# Altium footprint library ref-packages-longpad.PCBLIB: 1527 footprints (part 65 of 103)
Each footprint in its own frame and in the unit in brackets; x right, y up, seen from the top. Pads: shape width x height; smd on the part's side, far side on the other; paste and mask are expansions set on the pad; w line width, h text height; cw(c..) or ccw(c..) is an arc to the next point about the centre after c.
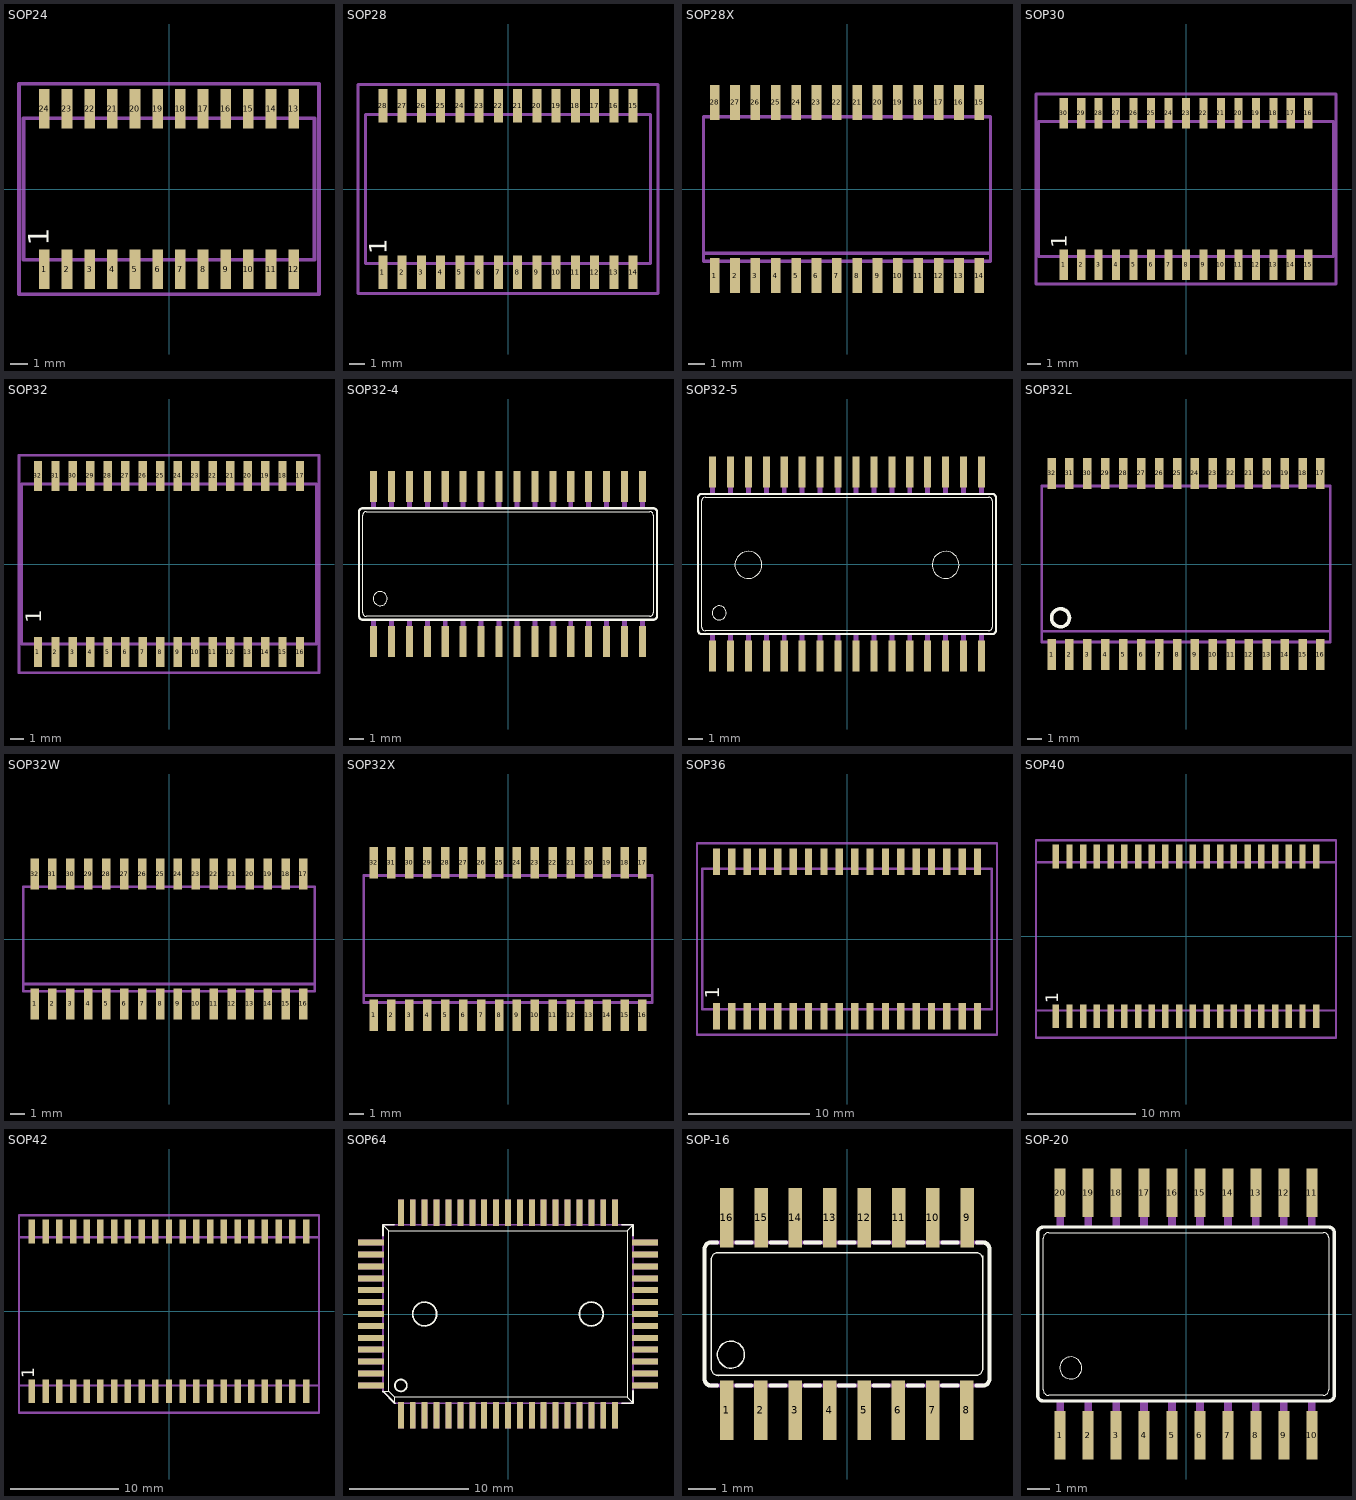
[diagram p64: the footprints below, top view; thin cyan lines are the x and y axes]

## SOP24 [mil]
pads (24):
  rect 23.62x86.61 smd: 1(-275,-177.17) 2(-225,-177.17) 3(-175,-177.17) 4(-125,-177.17) 5(-75,-177.17) 6(-25,-177.17) 7(25,-177.17) 8(75,-177.17) 9(125,-177.17) 10(175,-177.17) 11(225,-177.17) 12(275,-177.17) 13(275,177.17) 14(225,177.17) 15(175,177.17) 16(125,177.17) 17(75,177.17) 18(25,177.17) 19(-25,177.17) 20(-75,177.17) 21(-125,177.17) 22(-175,177.17) 23(-225,177.17) 24(-275,177.17)
Top Overlay:
  text "1" at -250,-125 h77.5
Mechanical 16:
  rectangle: -284.84,-212.2 -265.16,-159.84
  rectangle: -234.84,-212.2 -215.16,-159.84
  rectangle: -184.84,-212.2 -165.16,-159.84
  rectangle: -134.84,-212.2 -115.16,-159.84
  rectangle: -84.84,-212.2 -65.16,-159.84
  rectangle: -34.84,-212.2 -15.16,-159.84
  rectangle: 15.16,-212.2 34.84,-159.84
  rectangle: 65.16,-212.2 84.84,-159.84
  rectangle: 115.16,-212.2 134.84,-159.84
  rectangle: 165.16,-212.2 184.84,-159.84
  rectangle: 215.16,-212.2 234.84,-159.84
  rectangle: 265.16,-212.2 284.84,-159.84
  rectangle: 265.16,159.84 284.84,212.2
  rectangle: 215.16,159.84 234.84,212.2
  rectangle: 165.16,159.84 184.84,212.2
  rectangle: 115.16,159.84 134.84,212.2
  rectangle: 65.16,159.84 84.84,212.2
  rectangle: 15.16,159.84 34.84,212.2
  rectangle: -34.84,159.84 -15.16,212.2
  rectangle: -84.84,159.84 -65.16,212.2
  rectangle: -134.84,159.84 -115.16,212.2
  rectangle: -184.84,159.84 -165.16,212.2
  rectangle: -234.84,159.84 -215.16,212.2
  rectangle: -284.84,159.84 -265.16,212.2
  lines w8: -320.67,-155.91 320.67,-155.91 320.67,155.91 -320.67,155.91 -320.67,-155.91
Mechanical 27:
  lines w7.87: -330.71,-232.28 -330.71,232.28 330.71,232.28 330.71,-232.28 -330.71,-232.28

## SOP28 [mil]
pads (28):
  rect 23.62x86.61 smd: 1(-325,-216.54) 2(-275,-216.54) 3(-225,-216.54) 4(-175,-216.54) 5(-125,-216.54) 6(-75,-216.54) 7(-25,-216.54) 8(25,-216.54) 9(75,-216.54) 10(125,-216.54) 11(175,-216.54) 12(225,-216.54) 13(275,-216.54) 14(325,-216.54) 15(325,216.54) 16(275,216.54) 17(225,216.54) 18(175,216.54) 19(125,216.54) 20(75,216.54) 21(25,216.54) 22(-25,216.54) 23(-75,216.54) 24(-125,216.54) 25(-175,216.54) 26(-225,216.54) 27(-275,216.54) 28(-325,216.54)
Top Overlay:
  text "1" at -300,-169.69 h77.5
Mechanical 16:
  rectangle: -334.84,-249.61 -315.16,-197.24
  rectangle: -284.84,-249.61 -265.16,-197.24
  rectangle: -234.84,-249.61 -215.16,-197.24
  rectangle: -184.84,-249.61 -165.16,-197.24
  rectangle: -134.84,-249.61 -115.16,-197.24
  rectangle: -84.84,-249.61 -65.16,-197.24
  rectangle: -34.84,-249.61 -15.16,-197.24
  rectangle: 15.16,-249.61 34.84,-197.24
  rectangle: 65.16,-249.61 84.84,-197.24
  rectangle: 115.16,-249.61 134.84,-197.24
  rectangle: 165.16,-249.61 184.84,-197.24
  rectangle: 215.16,-249.61 234.84,-197.24
  rectangle: 265.16,-249.61 284.84,-197.24
  rectangle: 315.16,-249.61 334.84,-197.24
  rectangle: 315.16,197.24 334.84,249.61
  rectangle: 265.16,197.24 284.84,249.61
  rectangle: 215.16,197.24 234.84,249.61
  rectangle: 165.16,197.24 184.84,249.61
  rectangle: 115.16,197.24 134.84,249.61
  rectangle: 65.16,197.24 84.84,249.61
  rectangle: 15.16,197.24 34.84,249.61
  rectangle: -34.84,197.24 -15.16,249.61
  rectangle: -84.84,197.24 -65.16,249.61
  rectangle: -134.84,197.24 -115.16,249.61
  rectangle: -184.84,197.24 -165.16,249.61
  rectangle: -234.84,197.24 -215.16,249.61
  rectangle: -284.84,197.24 -265.16,249.61
  rectangle: -334.84,197.24 -315.16,249.61
  lines w8: -370.67,-193.31 370.67,-193.31 370.67,193.31 -370.67,193.31 -370.67,-193.31
Mechanical 27:
  lines w7.87: -389.76,-271.65 -389.76,271.65 389.76,271.65 389.76,-271.65 -389.76,-271.65

## SOP28X [mil]
pads (28):
  rect 23.62x86.61 smd: 1(-325,-212.6) 2(-275,-212.6) 3(-225,-212.6) 4(-175,-212.6) 5(-125,-212.6) 6(-75,-212.6) 7(-25,-212.6) 8(25,-212.6) 9(75,-212.6) 10(125,-212.6) 11(175,-212.6) 12(225,-212.6) 13(275,-212.6) 14(325,-212.6) 15(325,212.6) 16(275,212.6) 17(225,212.6) 18(175,212.6) 19(125,212.6) 20(75,212.6) 21(25,212.6) 22(-25,212.6) 23(-75,212.6) 24(-125,212.6) 25(-175,212.6) 26(-225,212.6) 27(-275,212.6) 28(-325,212.6)
Mechanical 16:
  rectangle: -334.65,-240.94 -315.35,-181.1
  rectangle: -284.65,-240.94 -265.35,-181.1
  rectangle: -234.65,-240.94 -215.35,-181.1
  rectangle: -184.65,-240.94 -165.35,-181.1
  rectangle: -134.65,-240.94 -115.35,-181.1
  rectangle: -84.65,-240.94 -65.35,-181.1
  rectangle: -34.65,-240.94 -15.35,-181.1
  rectangle: 15.35,-240.94 34.65,-181.1
  rectangle: 65.35,-240.94 84.65,-181.1
  rectangle: 115.35,-240.94 134.65,-181.1
  rectangle: 165.35,-240.94 184.65,-181.1
  rectangle: 215.35,-240.94 234.65,-181.1
  rectangle: 265.35,-240.94 284.65,-181.1
  rectangle: 315.35,-240.94 334.65,-181.1
  rectangle: 315.35,181.1 334.65,240.94
  rectangle: 265.35,181.1 284.65,240.94
  rectangle: 215.35,181.1 234.65,240.94
  rectangle: 165.35,181.1 184.65,240.94
  rectangle: 115.35,181.1 134.65,240.94
  rectangle: 65.35,181.1 84.65,240.94
  rectangle: 15.35,181.1 34.65,240.94
  rectangle: -34.65,181.1 -15.35,240.94
  rectangle: -84.65,181.1 -65.35,240.94
  rectangle: -134.65,181.1 -115.35,240.94
  rectangle: -184.65,181.1 -165.35,240.94
  rectangle: -234.65,181.1 -215.35,240.94
  rectangle: -284.65,181.1 -265.35,240.94
  rectangle: -334.65,181.1 -315.35,240.94
  lines w8: -352.36,-157.48 -352.36,-177.17 352.36,-177.17 352.36,-157.48 ; -352.36,-157.48 -352.36,177.17 352.36,177.17 352.36,-157.48 ; -352.36,-157.48 352.36,-157.48

## SOP30 [mil]
pads (30):
  rect 23.62x86.61 smd: 1(-350,-216.54) 2(-300,-216.54) 3(-250,-216.54) 4(-200,-216.54) 5(-150,-216.54) 6(-100,-216.54) 7(-50,-216.54) 8(0,-216.54) 9(50,-216.54) 10(100,-216.54) 11(150,-216.54) 12(200,-216.54) 13(250,-216.54) 14(300,-216.54) 15(350,-216.54) 16(350,216.54) 17(300,216.54) 18(250,216.54) 19(200,216.54) 20(150,216.54) 21(100,216.54) 22(50,216.54) 23(0,216.54) 24(-50,216.54) 25(-100,216.54) 26(-150,216.54) 27(-200,216.54) 28(-250,216.54) 29(-300,216.54) 30(-350,216.54)
Top Overlay:
  text "1" at -325,-169.69 h77.5
Mechanical 16:
  rectangle: -359.84,-249.61 -340.16,-197.24
  rectangle: -309.84,-249.61 -290.16,-197.24
  rectangle: -259.84,-249.61 -240.16,-197.24
  rectangle: -209.84,-249.61 -190.16,-197.24
  rectangle: -159.84,-249.61 -140.16,-197.24
  rectangle: -109.84,-249.61 -90.16,-197.24
  rectangle: -59.84,-249.61 -40.16,-197.24
  rectangle: -9.84,-249.61 9.84,-197.24
  rectangle: 40.16,-249.61 59.84,-197.24
  rectangle: 90.16,-249.61 109.84,-197.24
  rectangle: 140.16,-249.61 159.84,-197.24
  rectangle: 190.16,-249.61 209.84,-197.24
  rectangle: 240.16,-249.61 259.84,-197.24
  rectangle: 290.16,-249.61 309.84,-197.24
  rectangle: 340.16,-249.61 359.84,-197.24
  rectangle: 340.16,197.24 359.84,249.61
  rectangle: 290.16,197.24 309.84,249.61
  rectangle: 240.16,197.24 259.84,249.61
  rectangle: 190.16,197.24 209.84,249.61
  rectangle: 140.16,197.24 159.84,249.61
  rectangle: 90.16,197.24 109.84,249.61
  rectangle: 40.16,197.24 59.84,249.61
  rectangle: -9.84,197.24 9.84,249.61
  rectangle: -59.84,197.24 -40.16,249.61
  rectangle: -109.84,197.24 -90.16,249.61
  rectangle: -159.84,197.24 -140.16,249.61
  rectangle: -209.84,197.24 -190.16,249.61
  rectangle: -259.84,197.24 -240.16,249.61
  rectangle: -309.84,197.24 -290.16,249.61
  rectangle: -359.84,197.24 -340.16,249.61
  lines w8: -421.26,-193.31 421.26,-193.31 421.26,193.31 -421.26,193.31 -421.26,-193.31
Mechanical 27:
  lines w7.87: -429.13,-271.65 -429.13,271.65 429.13,271.65 429.13,-271.65 -429.13,-271.65

## SOP32 [mil]
pads (32):
  rect 23.62x86.61 smd: 1(-375,-251.97) 2(-325,-251.97) 3(-275,-251.97) 4(-225,-251.97) 5(-175,-251.97) 6(-125,-251.97) 7(-75,-251.97) 8(-25,-251.97) 9(25,-251.97) 10(75,-251.97) 11(125,-251.97) 12(175,-251.97) 13(225,-251.97) 14(275,-251.97) 15(325,-251.97) 16(375,-251.97) 17(375,251.97) 18(325,251.97) 19(275,251.97) 20(225,251.97) 21(175,251.97) 22(125,251.97) 23(75,251.97) 24(25,251.97) 25(-25,251.97) 26(-75,251.97) 27(-125,251.97) 28(-175,251.97) 29(-225,251.97) 30(-275,251.97) 31(-325,251.97) 32(-375,251.97)
Top Overlay:
  text "1" at -350,-169.69 h77.5
Mechanical 16:
  rectangle: -384.84,-285.04 -365.16,-232.68
  rectangle: -334.84,-285.04 -315.16,-232.68
  rectangle: -284.84,-285.04 -265.16,-232.68
  rectangle: -234.84,-285.04 -215.16,-232.68
  rectangle: -184.84,-285.04 -165.16,-232.68
  rectangle: -134.84,-285.04 -115.16,-232.68
  rectangle: -84.84,-285.04 -65.16,-232.68
  rectangle: -34.84,-285.04 -15.16,-232.68
  rectangle: 15.16,-285.04 34.84,-232.68
  rectangle: 65.16,-285.04 84.84,-232.68
  rectangle: 115.16,-285.04 134.84,-232.68
  rectangle: 165.16,-285.04 184.84,-232.68
  rectangle: 215.16,-285.04 234.84,-232.68
  rectangle: 265.16,-285.04 284.84,-232.68
  rectangle: 315.16,-285.04 334.84,-232.68
  rectangle: 365.16,-285.04 384.84,-232.68
  rectangle: 365.16,232.68 384.84,285.04
  rectangle: 315.16,232.68 334.84,285.04
  rectangle: 265.16,232.68 284.84,285.04
  rectangle: 215.16,232.68 234.84,285.04
  rectangle: 165.16,232.68 184.84,285.04
  rectangle: 115.16,232.68 134.84,285.04
  rectangle: 65.16,232.68 84.84,285.04
  rectangle: 15.16,232.68 34.84,285.04
  rectangle: -34.84,232.68 -15.16,285.04
  rectangle: -84.84,232.68 -65.16,285.04
  rectangle: -134.84,232.68 -115.16,285.04
  rectangle: -184.84,232.68 -165.16,285.04
  rectangle: -234.84,232.68 -215.16,285.04
  rectangle: -284.84,232.68 -265.16,285.04
  rectangle: -334.84,232.68 -315.16,285.04
  rectangle: -384.84,232.68 -365.16,285.04
  lines w8: -421.26,-228.74 421.26,-228.74 421.26,228.74 -421.26,228.74 -421.26,-228.74
Mechanical 27:
  lines w7.87: -429.13,-311.02 -429.13,311.02 429.13,311.02 429.13,-311.02 -429.13,-311.02

## SOP32-4 [mil]
pads (32):
  rect 19.69x86.61 smd: 1(-375,-216.54) 2(-325,-216.54) 3(-275,-216.54) 4(-225,-216.54) 5(-175,-216.54) 6(-125,-216.54) 7(-75,-216.54) 8(-25,-216.54) 9(25,-216.54) 10(75,-216.54) 11(125,-216.54) 12(175,-216.54) 13(225,-216.54) 14(275,-216.54) 15(325,-216.54) 16(375,-216.54) 17(375,216.54) 18(325,216.54) 19(275,216.54) 20(225,216.54) 21(175,216.54) 22(125,216.54) 23(75,216.54) 24(25,216.54) 25(-25,216.54) 26(-75,216.54) 27(-125,216.54) 28(-175,216.54) 29(-225,216.54) 30(-275,216.54) 31(-325,216.54) 32(-375,216.54)
Top Overlay:
  circle w2: c-356.1,-96.46 r19.69
  lines w2: -405.32,-135.83 -405.32,135.83 cw(c-395.48,135.82) -395.47,145.67 395.87,145.67 cw(c395.67,136.02) 405.32,136.22 405.32,-135.83 cw(c395.48,-135.82) 395.47,-145.67 -395.47,-145.67 cw(c-395.48,-135.82) -405.32,-135.83
  lines w6: -405.35,155.51 -405.32,155.51 ; -405.32,155.51 405.32,155.51 cw(c405.32,145.67) 415.16,145.67 415.16,-145.67 cw(c405.32,-145.67) 405.32,-155.51 -405.32,-155.51 cw(c-405.33,-145.67) -415.16,-146.06 -415.16,145.67 cw(c-405.32,145.67) -405.32,155.51
Mechanical 16:
  rectangle: -281.89,155.51 -268.11,236.22
  rectangle: -231.89,155.51 -218.11,236.22
  rectangle: -181.89,155.51 -168.11,236.22
  rectangle: -131.89,155.51 -118.11,236.22
  rectangle: -81.89,155.51 -68.11,236.22
  rectangle: -31.89,155.51 -18.11,236.22
  rectangle: 18.11,155.51 31.89,236.22
  rectangle: 68.11,155.51 81.89,236.22
  rectangle: 118.11,155.51 131.89,236.22
  rectangle: 168.11,155.51 181.89,236.22
  rectangle: 218.11,155.51 231.89,236.22
  rectangle: 268.11,155.51 281.89,236.22
  rectangle: -281.89,-236.22 -268.11,-155.51
  rectangle: -231.89,-236.22 -218.11,-155.51
  rectangle: -181.89,-236.22 -168.11,-155.51
  rectangle: -131.89,-236.22 -118.11,-155.51
  rectangle: -81.89,-236.22 -68.11,-155.51
  rectangle: -31.89,-236.22 -18.11,-155.51
  rectangle: 18.11,-236.22 31.89,-155.51
  rectangle: 68.11,-236.22 81.89,-155.51
  rectangle: 118.11,-236.22 131.89,-155.51
  rectangle: 168.11,-236.22 181.89,-155.51
  rectangle: 218.11,-236.22 231.89,-155.51
  rectangle: 268.11,-236.22 281.89,-155.51
  rectangle: 318.11,155.51 331.89,236.22
  rectangle: 368.11,155.51 381.89,236.22
  rectangle: 318.11,-236.22 331.89,-155.51
  rectangle: 368.11,-236.22 381.89,-155.51
  rectangle: -381.89,155.51 -368.11,236.22
  rectangle: -331.89,155.51 -318.11,236.22
  rectangle: -381.89,-236.22 -368.11,-155.51
  rectangle: -331.89,-236.22 -318.11,-155.51

## SOP32-5 [mil]
pads (32):
  rect 19.69x86.61 smd: 1(-375,-256.54) 2(-325,-256.54) 3(-275,-256.54) 4(-225,-256.54) 5(-175,-256.54) 6(-125,-256.54) 7(-75,-256.54) 8(-25,-256.54) 9(25,-256.54) 10(75,-256.54) 11(125,-256.54) 12(175,-256.54) 13(225,-256.54) 14(275,-256.54) 15(325,-256.54) 16(375,-256.54) 17(375,256.54) 18(325,256.54) 19(275,256.54) 20(225,256.54) 21(175,256.54) 22(125,256.54) 23(75,256.54) 24(25,256.54) 25(-25,256.54) 26(-75,256.54) 27(-125,256.54) 28(-175,256.54) 29(-225,256.54) 30(-275,256.54) 31(-325,256.54) 32(-375,256.54)
Top Overlay:
  circle w2: c-356.1,-136.46 r19.69
  circle w2: c-275,-2.5 r37.5
  circle w2: c275,-2.5 r37.5
  lines w2: -405.32,-175.83 -405.32,175.83 cw(c-395.48,175.82) -395.47,185.67 395.87,185.67 cw(c395.67,176.02) 405.32,176.22 405.32,-175.83 cw(c395.48,-175.82) 395.47,-185.67 -395.47,-185.67 cw(c-395.48,-175.82) -405.32,-175.83
  lines w6: -405.35,195.51 -405.32,195.51 ; -405.32,195.51 405.32,195.51 cw(c405.32,185.67) 415.16,185.67 415.16,-185.67 cw(c405.32,-185.67) 405.32,-195.51 -405.32,-195.51 cw(c-405.33,-185.67) -415.16,-186.06 -415.16,185.67 cw(c-405.32,185.67) -405.32,195.51
Mechanical 16:
  rectangle: -281.89,195.51 -268.11,276.22
  rectangle: -231.89,195.51 -218.11,276.22
  rectangle: -181.89,195.51 -168.11,276.22
  rectangle: -131.89,195.51 -118.11,276.22
  rectangle: -81.89,195.51 -68.11,276.22
  rectangle: -31.89,195.51 -18.11,276.22
  rectangle: 18.11,195.51 31.89,276.22
  rectangle: 68.11,195.51 81.89,276.22
  rectangle: 118.11,195.51 131.89,276.22
  rectangle: 168.11,195.51 181.89,276.22
  rectangle: 218.11,195.51 231.89,276.22
  rectangle: 268.11,195.51 281.89,276.22
  rectangle: -281.89,-276.22 -268.11,-195.51
  rectangle: -231.89,-276.22 -218.11,-195.51
  rectangle: -181.89,-276.22 -168.11,-195.51
  rectangle: -131.89,-276.22 -118.11,-195.51
  rectangle: -81.89,-276.22 -68.11,-195.51
  rectangle: -31.89,-276.22 -18.11,-195.51
  rectangle: 18.11,-276.22 31.89,-195.51
  rectangle: 68.11,-276.22 81.89,-195.51
  rectangle: 118.11,-276.22 131.89,-195.51
  rectangle: 168.11,-276.22 181.89,-195.51
  rectangle: 218.11,-276.22 231.89,-195.51
  rectangle: 268.11,-276.22 281.89,-195.51
  rectangle: 318.11,195.51 331.89,276.22
  rectangle: 368.11,195.51 381.89,276.22
  rectangle: 318.11,-276.22 331.89,-195.51
  rectangle: 368.11,-276.22 381.89,-195.51
  rectangle: -381.89,195.51 -368.11,276.22
  rectangle: -331.89,195.51 -318.11,276.22
  rectangle: -381.89,-276.22 -368.11,-195.51
  rectangle: -331.89,-276.22 -318.11,-195.51

## SOP32L [mil]
pads (32):
  rect 23.62x86.61 smd: 1(-375,-252.6) 2(-325,-252.6) 3(-275,-252.6) 4(-225,-252.6) 5(-175,-252.6) 6(-125,-252.6) 7(-75,-252.6) 8(-25,-252.6) 9(25,-252.6) 10(75,-252.6) 11(125,-252.6) 12(175,-252.6) 13(225,-252.6) 14(275,-252.6) 15(325,-252.6) 16(375,-252.6) 17(375,252.6) 18(325,252.6) 19(275,252.6) 20(225,252.6) 21(175,252.6) 22(125,252.6) 23(75,252.6) 24(25,252.6) 25(-25,252.6) 26(-75,252.6) 27(-125,252.6) 28(-175,252.6) 29(-225,252.6) 30(-275,252.6) 31(-325,252.6) 32(-375,252.6)
Top Overlay:
  circle w10: c-350,-150 r25
Mechanical 16:
  rectangle: -384.65,-280.94 -365.35,-221.1
  rectangle: -334.65,-280.94 -315.35,-221.1
  rectangle: -284.65,-280.94 -265.35,-221.1
  rectangle: -234.65,-280.94 -215.35,-221.1
  rectangle: -184.65,-280.94 -165.35,-221.1
  rectangle: -134.65,-280.94 -115.35,-221.1
  rectangle: -84.65,-280.94 -65.35,-221.1
  rectangle: -34.65,-280.94 -15.35,-221.1
  rectangle: 15.35,-280.94 34.65,-221.1
  rectangle: 65.35,-280.94 84.65,-221.1
  rectangle: 115.35,-280.94 134.65,-221.1
  rectangle: 165.35,-280.94 184.65,-221.1
  rectangle: 215.35,-280.94 234.65,-221.1
  rectangle: 265.35,-280.94 284.65,-221.1
  rectangle: 315.35,-280.94 334.65,-221.1
  rectangle: 365.35,-280.94 384.65,-221.1
  rectangle: 365.35,221.1 384.65,280.94
  rectangle: 315.35,221.1 334.65,280.94
  rectangle: 265.35,221.1 284.65,280.94
  rectangle: 215.35,221.1 234.65,280.94
  rectangle: 165.35,221.1 184.65,280.94
  rectangle: 115.35,221.1 134.65,280.94
  rectangle: 65.35,221.1 84.65,280.94
  rectangle: 15.35,221.1 34.65,280.94
  rectangle: -34.65,221.1 -15.35,280.94
  rectangle: -84.65,221.1 -65.35,280.94
  rectangle: -134.65,221.1 -115.35,280.94
  rectangle: -184.65,221.1 -165.35,280.94
  rectangle: -234.65,221.1 -215.35,280.94
  rectangle: -284.65,221.1 -265.35,280.94
  rectangle: -334.65,221.1 -315.35,280.94
  rectangle: -384.65,221.1 -365.35,280.94
  lines w8: -402.36,-187.48 -402.36,-217.17 402.36,-217.17 402.36,-187.48 ; -402.36,-187.48 -402.36,217.17 402.36,217.17 402.36,-187.48 ; -402.36,-187.48 402.36,-187.48

## SOP32W [mil]
pads (32):
  rect 23.62x86.61 smd: 1(-375,-181.1) 2(-325,-181.1) 3(-275,-181.1) 4(-225,-181.1) 5(-175,-181.1) 6(-125,-181.1) 7(-75,-181.1) 8(-25,-181.1) 9(25,-181.1) 10(75,-181.1) 11(125,-181.1) 12(175,-181.1) 13(225,-181.1) 14(275,-181.1) 15(325,-181.1) 16(375,-181.1) 17(375,181.1) 18(325,181.1) 19(275,181.1) 20(225,181.1) 21(175,181.1) 22(125,181.1) 23(75,181.1) 24(25,181.1) 25(-25,181.1) 26(-75,181.1) 27(-125,181.1) 28(-175,181.1) 29(-225,181.1) 30(-275,181.1) 31(-325,181.1) 32(-375,181.1)
Mechanical 16:
  rectangle: -384.65,-209.45 -365.35,-149.61
  rectangle: -334.65,-209.45 -315.35,-149.61
  rectangle: -284.65,-209.45 -265.35,-149.61
  rectangle: -234.65,-209.45 -215.35,-149.61
  rectangle: -184.65,-209.45 -165.35,-149.61
  rectangle: -134.65,-209.45 -115.35,-149.61
  rectangle: -84.65,-209.45 -65.35,-149.61
  rectangle: -34.65,-209.45 -15.35,-149.61
  rectangle: 15.35,-209.45 34.65,-149.61
  rectangle: 65.35,-209.45 84.65,-149.61
  rectangle: 115.35,-209.45 134.65,-149.61
  rectangle: 165.35,-209.45 184.65,-149.61
  rectangle: 215.35,-209.45 234.65,-149.61
  rectangle: 265.35,-209.45 284.65,-149.61
  rectangle: 315.35,-209.45 334.65,-149.61
  rectangle: 365.35,-209.45 384.65,-149.61
  rectangle: 365.35,149.61 384.65,209.45
  rectangle: 315.35,149.61 334.65,209.45
  rectangle: 265.35,149.61 284.65,209.45
  rectangle: 215.35,149.61 234.65,209.45
  rectangle: 165.35,149.61 184.65,209.45
  rectangle: 115.35,149.61 134.65,209.45
  rectangle: 65.35,149.61 84.65,209.45
  rectangle: 15.35,149.61 34.65,209.45
  rectangle: -34.65,149.61 -15.35,209.45
  rectangle: -84.65,149.61 -65.35,209.45
  rectangle: -134.65,149.61 -115.35,209.45
  rectangle: -184.65,149.61 -165.35,209.45
  rectangle: -234.65,149.61 -215.35,209.45
  rectangle: -284.65,149.61 -265.35,209.45
  rectangle: -334.65,149.61 -315.35,209.45
  rectangle: -384.65,149.61 -365.35,209.45
  lines w8: -406.3,-125.98 -406.3,-145.67 406.3,-145.67 406.3,-125.98 ; -406.3,-125.98 -406.3,145.67 406.3,145.67 406.3,-125.98 ; -406.3,-125.98 406.3,-125.98

## SOP32X [mil]
pads (32):
  rect 23.62x86.61 smd: 1(-375,-212.6) 2(-325,-212.6) 3(-275,-212.6) 4(-225,-212.6) 5(-175,-212.6) 6(-125,-212.6) 7(-75,-212.6) 8(-25,-212.6) 9(25,-212.6) 10(75,-212.6) 11(125,-212.6) 12(175,-212.6) 13(225,-212.6) 14(275,-212.6) 15(325,-212.6) 16(375,-212.6) 17(375,212.6) 18(325,212.6) 19(275,212.6) 20(225,212.6) 21(175,212.6) 22(125,212.6) 23(75,212.6) 24(25,212.6) 25(-25,212.6) 26(-75,212.6) 27(-125,212.6) 28(-175,212.6) 29(-225,212.6) 30(-275,212.6) 31(-325,212.6) 32(-375,212.6)
Mechanical 16:
  rectangle: -384.65,-240.94 -365.35,-181.1
  rectangle: -334.65,-240.94 -315.35,-181.1
  rectangle: -284.65,-240.94 -265.35,-181.1
  rectangle: -234.65,-240.94 -215.35,-181.1
  rectangle: -184.65,-240.94 -165.35,-181.1
  rectangle: -134.65,-240.94 -115.35,-181.1
  rectangle: -84.65,-240.94 -65.35,-181.1
  rectangle: -34.65,-240.94 -15.35,-181.1
  rectangle: 15.35,-240.94 34.65,-181.1
  rectangle: 65.35,-240.94 84.65,-181.1
  rectangle: 115.35,-240.94 134.65,-181.1
  rectangle: 165.35,-240.94 184.65,-181.1
  rectangle: 215.35,-240.94 234.65,-181.1
  rectangle: 265.35,-240.94 284.65,-181.1
  rectangle: 315.35,-240.94 334.65,-181.1
  rectangle: 365.35,-240.94 384.65,-181.1
  rectangle: 365.35,181.1 384.65,240.94
  rectangle: 315.35,181.1 334.65,240.94
  rectangle: 265.35,181.1 284.65,240.94
  rectangle: 215.35,181.1 234.65,240.94
  rectangle: 165.35,181.1 184.65,240.94
  rectangle: 115.35,181.1 134.65,240.94
  rectangle: 65.35,181.1 84.65,240.94
  rectangle: 15.35,181.1 34.65,240.94
  rectangle: -34.65,181.1 -15.35,240.94
  rectangle: -84.65,181.1 -65.35,240.94
  rectangle: -134.65,181.1 -115.35,240.94
  rectangle: -184.65,181.1 -165.35,240.94
  rectangle: -234.65,181.1 -215.35,240.94
  rectangle: -284.65,181.1 -265.35,240.94
  rectangle: -334.65,181.1 -315.35,240.94
  rectangle: -384.65,181.1 -365.35,240.94
  lines w8: -402.36,-157.48 -402.36,-177.17 402.36,-177.17 402.36,-157.48 ; -402.36,-157.48 -402.36,177.17 402.36,177.17 402.36,-157.48 ; -402.36,-157.48 402.36,-157.48

## SOP36 [mil]
pads (36):
  rect 23.62x86.61 smd: 1(-425,-251.97) 2(-375,-251.97) 3(-325,-251.97) 4(-275,-251.97) 5(-225,-251.97) 6(-175,-251.97) 7(-125,-251.97) 8(-75,-251.97) 9(-25,-251.97) 10(25,-251.97) 11(75,-251.97) 12(125,-251.97) 13(175,-251.97) 14(225,-251.97) 15(275,-251.97) 16(325,-251.97) 17(375,-251.97) 18(425,-251.97) 19(425,251.97) 20(375,251.97) 21(325,251.97) 22(275,251.97) 23(225,251.97) 24(175,251.97) 25(125,251.97) 26(75,251.97) 27(25,251.97) 28(-25,251.97) 29(-75,251.97) 30(-125,251.97) 31(-175,251.97) 32(-225,251.97) 33(-275,251.97) 34(-325,251.97) 35(-375,251.97) 36(-425,251.97)
Top Overlay:
  text "1" at -400,-194.69 h77.5
Mechanical 16:
  rectangle: -434.84,-285.04 -415.16,-232.68
  rectangle: -384.84,-285.04 -365.16,-232.68
  rectangle: -334.84,-285.04 -315.16,-232.68
  rectangle: -284.84,-285.04 -265.16,-232.68
  rectangle: -234.84,-285.04 -215.16,-232.68
  rectangle: -184.84,-285.04 -165.16,-232.68
  rectangle: -134.84,-285.04 -115.16,-232.68
  rectangle: -84.84,-285.04 -65.16,-232.68
  rectangle: -34.84,-285.04 -15.16,-232.68
  rectangle: 15.16,-285.04 34.84,-232.68
  rectangle: 65.16,-285.04 84.84,-232.68
  rectangle: 115.16,-285.04 134.84,-232.68
  rectangle: 165.16,-285.04 184.84,-232.68
  rectangle: 215.16,-285.04 234.84,-232.68
  rectangle: 265.16,-285.04 284.84,-232.68
  rectangle: 315.16,-285.04 334.84,-232.68
  rectangle: 365.16,-285.04 384.84,-232.68
  rectangle: 415.16,-285.04 434.84,-232.68
  rectangle: 415.16,232.68 434.84,285.04
  rectangle: 365.16,232.68 384.84,285.04
  rectangle: 315.16,232.68 334.84,285.04
  rectangle: 265.16,232.68 284.84,285.04
  rectangle: 215.16,232.68 234.84,285.04
  rectangle: 165.16,232.68 184.84,285.04
  rectangle: 115.16,232.68 134.84,285.04
  rectangle: 65.16,232.68 84.84,285.04
  rectangle: 15.16,232.68 34.84,285.04
  rectangle: -34.84,232.68 -15.16,285.04
  rectangle: -84.84,232.68 -65.16,285.04
  rectangle: -134.84,232.68 -115.16,285.04
  rectangle: -184.84,232.68 -165.16,285.04
  rectangle: -234.84,232.68 -215.16,285.04
  rectangle: -284.84,232.68 -265.16,285.04
  rectangle: -334.84,232.68 -315.16,285.04
  rectangle: -384.84,232.68 -365.16,285.04
  rectangle: -434.84,232.68 -415.16,285.04
  lines w8: -471.26,-228.74 471.26,-228.74 471.26,228.74 -471.26,228.74 -471.26,-228.74
Mechanical 27:
  lines w7.87: -488.19,-311.02 -488.19,311.02 488.19,311.02 488.19,-311.02 -488.19,-311.02

## SOP40 [mil]
pads (40):
  rect 23.62x86.61 smd: 1(-475,-291.34) 2(-425,-291.34) 3(-375,-291.34) 4(-325,-291.34) 5(-275,-291.34) 6(-225,-291.34) 7(-175,-291.34) 8(-125,-291.34) 9(-75,-291.34) 10(-25,-291.34) 11(25,-291.34) 12(75,-291.34) 13(125,-291.34) 14(175,-291.34) 15(225,-291.34) 16(275,-291.34) 17(325,-291.34) 18(375,-291.34) 19(425,-291.34) 20(475,-291.34) 21(475,291.34) 22(425,291.34) 23(375,291.34) 24(325,291.34) 25(275,291.34) 26(225,291.34) 27(175,291.34) 28(125,291.34) 29(75,291.34) 30(25,291.34) 31(-25,291.34) 32(-75,291.34) 33(-125,291.34) 34(-175,291.34) 35(-225,291.34) 36(-275,291.34) 37(-325,291.34) 38(-375,291.34) 39(-425,291.34) 40(-475,291.34)
Top Overlay:
  text "1" at -450,-244.69 h77.5
Mechanical 16:
  rectangle: -484.65,-324.8 -465.35,-274.41
  rectangle: -434.65,-324.8 -415.35,-274.41
  rectangle: -384.65,-324.8 -365.35,-274.41
  rectangle: -334.65,-324.8 -315.35,-274.41
  rectangle: -284.65,-324.8 -265.35,-274.41
  rectangle: -234.65,-324.8 -215.35,-274.41
  rectangle: -184.65,-324.8 -165.35,-274.41
  rectangle: -134.65,-324.8 -115.35,-274.41
  rectangle: -84.65,-324.8 -65.35,-274.41
  rectangle: -34.65,-324.8 -15.35,-274.41
  rectangle: 15.35,-324.8 34.65,-274.41
  rectangle: 65.35,-324.8 84.65,-274.41
  rectangle: 115.35,-324.8 134.65,-274.41
  rectangle: 165.35,-324.8 184.65,-274.41
  rectangle: 215.35,-324.8 234.65,-274.41
  rectangle: 265.35,-324.8 284.65,-274.41
  rectangle: 315.35,-324.8 334.65,-274.41
  rectangle: 365.35,-324.8 384.65,-274.41
  rectangle: 415.35,-324.8 434.65,-274.41
  rectangle: 465.35,-324.8 484.65,-274.41
  rectangle: 465.35,274.41 484.65,324.8
  rectangle: 415.35,274.41 434.65,324.8
  rectangle: 365.35,274.41 384.65,324.8
  rectangle: 315.35,274.41 334.65,324.8
  rectangle: 265.35,274.41 284.65,324.8
  rectangle: 215.35,274.41 234.65,324.8
  rectangle: 165.35,274.41 184.65,324.8
  rectangle: 115.35,274.41 134.65,324.8
  rectangle: 65.35,274.41 84.65,324.8
  rectangle: 15.35,274.41 34.65,324.8
  rectangle: -34.65,274.41 -15.35,324.8
  rectangle: -84.65,274.41 -65.35,324.8
  rectangle: -134.65,274.41 -115.35,324.8
  rectangle: -184.65,274.41 -165.35,324.8
  rectangle: -234.65,274.41 -215.35,324.8
  rectangle: -284.65,274.41 -265.35,324.8
  rectangle: -334.65,274.41 -315.35,324.8
  rectangle: -384.65,274.41 -365.35,324.8
  rectangle: -434.65,274.41 -415.35,324.8
  rectangle: -484.65,274.41 -465.35,324.8
  lines w8: -547.24,-270.47 547.24,-270.47 547.24,270.47 -547.24,270.47 -547.24,-270.47
Mechanical 27:
  lines w7.87: -547.24,-370.08 -547.24,350.39 547.24,350.39 547.24,-370.08 -547.24,-370.08

## SOP42 [mil]
pads (42):
  rect 23.62x86.61 smd: 1(-500,-291.34) 2(-450,-291.34) 3(-400,-291.34) 4(-350,-291.34) 5(-300,-291.34) 6(-250,-291.34) 7(-200,-291.34) 8(-150,-291.34) 9(-100,-291.34) 10(-50,-291.34) 11(0,-291.34) 12(50,-291.34) 13(100,-291.34) 14(150,-291.34) 15(200,-291.34) 16(250,-291.34) 17(300,-291.34) 18(350,-291.34) 19(400,-291.34) 20(450,-291.34) 21(500,-291.34) 22(500,291.34) 23(450,291.34) 24(400,291.34) 25(350,291.34) 26(300,291.34) 27(250,291.34) 28(200,291.34) 29(150,291.34) 30(100,291.34) 31(50,291.34) 32(0,291.34) 33(-50,291.34) 34(-100,291.34) 35(-150,291.34) 36(-200,291.34) 37(-250,291.34) 38(-300,291.34) 39(-350,291.34) 40(-400,291.34) 41(-450,291.34) 42(-500,291.34)
Top Overlay:
  text "1" at -475,-244.69 h77.5
Mechanical 16:
  rectangle: -509.65,-324.8 -490.35,-274.41
  rectangle: -459.65,-324.8 -440.35,-274.41
  rectangle: -409.65,-324.8 -390.35,-274.41
  rectangle: -359.65,-324.8 -340.35,-274.41
  rectangle: -309.65,-324.8 -290.35,-274.41
  rectangle: -259.65,-324.8 -240.35,-274.41
  rectangle: -209.65,-324.8 -190.35,-274.41
  rectangle: -159.65,-324.8 -140.35,-274.41
  rectangle: -109.65,-324.8 -90.35,-274.41
  rectangle: -59.65,-324.8 -40.35,-274.41
  rectangle: -9.65,-324.8 9.65,-274.41
  rectangle: 40.35,-324.8 59.65,-274.41
  rectangle: 90.35,-324.8 109.65,-274.41
  rectangle: 140.35,-324.8 159.65,-274.41
  rectangle: 190.35,-324.8 209.65,-274.41
  rectangle: 240.35,-324.8 259.65,-274.41
  rectangle: 290.35,-324.8 309.65,-274.41
  rectangle: 340.35,-324.8 359.65,-274.41
  rectangle: 390.35,-324.8 409.65,-274.41
  rectangle: 440.35,-324.8 459.65,-274.41
  rectangle: 490.35,-324.8 509.65,-274.41
  rectangle: 490.35,274.41 509.65,324.8
  rectangle: 440.35,274.41 459.65,324.8
  rectangle: 390.35,274.41 409.65,324.8
  rectangle: 340.35,274.41 359.65,324.8
  rectangle: 290.35,274.41 309.65,324.8
  rectangle: 240.35,274.41 259.65,324.8
  rectangle: 190.35,274.41 209.65,324.8
  rectangle: 140.35,274.41 159.65,324.8
  rectangle: 90.35,274.41 109.65,324.8
  rectangle: 40.35,274.41 59.65,324.8
  rectangle: -9.65,274.41 9.65,324.8
  rectangle: -59.65,274.41 -40.35,324.8
  rectangle: -109.65,274.41 -90.35,324.8
  rectangle: -159.65,274.41 -140.35,324.8
  rectangle: -209.65,274.41 -190.35,324.8
  rectangle: -259.65,274.41 -240.35,324.8
  rectangle: -309.65,274.41 -290.35,324.8
  rectangle: -359.65,274.41 -340.35,324.8
  rectangle: -409.65,274.41 -390.35,324.8
  rectangle: -459.65,274.41 -440.35,324.8
  rectangle: -509.65,274.41 -490.35,324.8
  lines w8: -547.24,-270.47 547.24,-270.47 547.24,270.47 -547.24,270.47 -547.24,-270.47
Mechanical 27:
  lines w7.87: -547.24,-370.08 -547.24,350.39 547.24,350.39 547.24,-370.08 -547.24,-370.08

## SOP64 [mm]
pads (64):
  rect 0.5x2.2 smd: 1(-9,-8.5) 2(-8,-8.5) 3(-7,-8.5) 4(-6,-8.5) 5(-5,-8.5) 6(-4,-8.5) 7(-3,-8.5) 8(-2,-8.5) 9(-1,-8.5) 10(0,-8.5) 11(1,-8.5) 12(2,-8.5) 13(3,-8.5) 14(4,-8.5) 15(5,-8.5) 16(6,-8.5) 17(7,-8.5) 18(8,-8.5) 19(9,-8.5) 33(9,8.5) 34(8,8.5) 35(7,8.5) 36(6,8.5) 37(5,8.5) 38(4,8.5) 39(3,8.5) 40(2,8.5) 41(1,8.5) 42(0,8.5) 43(-1,8.5) 44(-2,8.5) 45(-3,8.5) 46(-4,8.5) 47(-5,8.5) 48(-6,8.5) 49(-7,8.5) 50(-8,8.5) 51(-9,8.5)
  rect 2.2x0.5 smd: 20(11.5,-6) 21(11.5,-5) 22(11.5,-4) 23(11.5,-3) 24(11.5,-2) 25(11.5,-1) 26(11.5,0) 27(11.5,1) 28(11.5,2) 29(11.5,3) 30(11.5,4) 31(11.5,5) 32(11.5,6) 52(-11.5,6) 53(-11.5,5) 54(-11.5,4) 55(-11.5,3) 56(-11.5,2) 57(-11.5,1) 58(-11.5,0) 59(-11.5,-1) 60(-11.5,-2) 61(-11.5,-3) 62(-11.5,-4) 63(-11.5,-5) 64(-11.5,-6)
Top Overlay:
  circle w0.152: c-9,-6 r0.5
  circle w0.152: c-7,0 r1
  circle w0.152: c7,0 r1
  lines w0.051: -10.5,-6.5 -10,-6.5 ; -10.5,7.5 -10,7 ; -9.5,-7.5 -9.5,-7 ; 10.5,-7.5 10,-7 ; 10.5,7.5 10,7 ; -10,-6.5 -9.5,-7 ; -10,-6.5 -10,7 ; -10,7 10,7 ; -9.5,-7 10,-7 ; 10,-7 10,7
  lines w0.152: -10.5,-6.5 -9.5,-7.5 ; -10.5,6.581 -10.5,7.5 -9.566,7.5 ; 9.55,-7.5 10.5,-7.5 10.5,-6.47 ; 9.566,7.5 10.5,7.5 10.5,6.597
Mechanical 16:
  rectangle: -9.25,7.55 -8.75,9.6
  rectangle: -8.25,7.55 -7.75,9.6
  rectangle: -7.25,7.55 -6.75,9.6
  rectangle: -6.25,7.55 -5.75,9.6
  rectangle: -5.25,7.55 -4.75,9.6
  rectangle: -4.25,7.55 -3.75,9.6
  rectangle: -3.25,7.55 -2.75,9.6
  rectangle: -2.25,7.55 -1.75,9.6
  rectangle: -1.25,7.55 -0.75,9.6
  rectangle: -0.25,7.55 0.25,9.6
  rectangle: 0.75,7.55 1.25,9.6
  rectangle: 1.75,7.55 2.25,9.6
  rectangle: 2.75,7.55 3.25,9.6
  rectangle: 3.75,7.55 4.25,9.6
  rectangle: 4.75,7.55 5.25,9.6
  rectangle: 5.75,7.55 6.25,9.6
  rectangle: 6.75,7.55 7.25,9.6
  rectangle: 7.75,7.55 8.25,9.6
  rectangle: 8.75,7.55 9.25,9.6
  rectangle: 10.55,5.75 12.6,6.25
  rectangle: 10.55,4.75 12.6,5.25
  rectangle: 10.55,3.75 12.6,4.25
  rectangle: 10.55,2.75 12.6,3.25
  rectangle: 10.55,1.75 12.6,2.25
  rectangle: 10.55,0.75 12.6,1.25
  rectangle: 10.55,-0.25 12.6,0.25
  rectangle: 10.55,-1.25 12.6,-0.75
  rectangle: 10.55,-2.25 12.6,-1.75
  rectangle: 10.55,-3.25 12.6,-2.75
  rectangle: 10.55,-4.25 12.6,-3.75
  rectangle: 10.55,-5.25 12.6,-4.75
  rectangle: 10.55,-6.25 12.6,-5.75
  rectangle: 8.75,-9.6 9.25,-7.55
  rectangle: 7.75,-9.6 8.25,-7.55
  rectangle: 6.75,-9.6 7.25,-7.55
  rectangle: 5.75,-9.6 6.25,-7.55
  rectangle: 4.75,-9.6 5.25,-7.55
  rectangle: 3.75,-9.6 4.25,-7.55
  rectangle: 2.75,-9.6 3.25,-7.55
  rectangle: 1.75,-9.6 2.25,-7.55
  rectangle: 0.75,-9.6 1.25,-7.55
  rectangle: -0.25,-9.6 0.25,-7.55
  rectangle: -1.25,-9.6 -0.75,-7.55
  rectangle: -2.25,-9.6 -1.75,-7.55
  rectangle: -3.25,-9.6 -2.75,-7.55
  rectangle: -4.25,-9.6 -3.75,-7.55
  rectangle: -5.25,-9.6 -4.75,-7.55
  rectangle: -6.25,-9.6 -5.75,-7.55
  rectangle: -7.25,-9.6 -6.75,-7.55
  rectangle: -8.25,-9.6 -7.75,-7.55
  rectangle: -9.25,-9.6 -8.75,-7.55
  rectangle: -12.6,-6.25 -10.55,-5.75
  rectangle: -12.6,-5.25 -10.55,-4.75
  rectangle: -12.6,-4.25 -10.55,-3.75
  rectangle: -12.6,-3.25 -10.55,-2.75
  rectangle: -12.6,-2.25 -10.55,-1.75
  rectangle: -12.6,-1.25 -10.55,-0.75
  rectangle: -12.6,-0.25 -10.55,0.25
  rectangle: -12.6,0.75 -10.55,1.25
  rectangle: -12.6,1.75 -10.55,2.25
  rectangle: -12.6,2.75 -10.55,3.25
  rectangle: -12.6,3.75 -10.55,4.25
  rectangle: -12.6,4.75 -10.55,5.25
  rectangle: -12.6,5.75 -10.55,6.25
  lines w0.152: -10.5,-6.5 -10.5,7.5 10.5,7.5 10.5,-7.5 -9.5,-7.5 -10.5,-6.5

## SOP-16 [mil]
pads (16):
  rect 19.69x86.61 smd: 1(-175,-139.76) 2(-125.39,-139.76) 3(-75.39,-139.76) 4(-25.39,-139.76) 5(25,-139.76) 6(74.61,-139.76) 7(124.61,-139.76) 8(174.61,-139.76) 9(175,139.76) 10(125,139.76) 11(75,139.76) 12(25,139.76) 13(-25,139.76) 14(-75,139.76) 15(-125,139.76) 16(-175,139.76)
Top Overlay:
  circle w2: c-168.9,-59.06 r19.69
  lines w2: -187.8,-89.49 187.6,-89.49 ccw(c187.6,-79.65) 197.44,-79.65 197.44,79.65 ; -187.6,-89.61 cw(c-187.59,-79.77) -197.44,-79.76 -197.44,79.65 cw(c-187.59,79.65) -187.56,89.5 187.6,89.49 cw(c187.6,79.65) 197.44,79.65 ; 197.44,84.65 197.44,79.65
  lines w6: -198.82,104.33 -189.02,104.33 ; -197.44,-104.33 cw(c-197.54,-94.33) -197.64,-104.33 ; -197.44,104.33 ccw(c-197.44,94.49) -207.28,94.49 -207.28,-94.49 ccw(c-197.44,-94.49) -197.64,-104.33 ; -189.02,-104.33 -197.64,-104.33 ; -160.98,-104.33 -139.41,-104.33 ; -160.98,104.33 -139.02,104.33 ; -111.38,-104.33 -89.41,-104.33 ; -110.98,104.33 -89.02,104.33 ; -61.38,-104.33 -39.41,-104.33 ; -60.98,104.33 -39.02,104.33 ; -11.38,-104.33 10.98,-104.33 ; -10.98,104.33 10.98,104.33 ; 39.02,-104.33 60.59,-104.33 ; 39.02,104.33 60.98,104.33 ; 88.62,-104.33 110.59,-104.33 ; 89.02,104.33 110.98,104.33 ; 138.62,-104.33 160.59,-104.33 ; 139.02,104.33 160.98,104.33 ; 188.62,-104.33 197.24,-104.33 ; 189.02,104.33 197.64,104.33 ; 197.44,-104.33 ccw(c197.44,-94.49) 207.28,-94.49 207.28,94.49 ccw(c197.44,94.49) 197.64,104.33 ; 197.44,104.33 cw(c197.54,94.33) 197.64,104.33
Mechanical 16:
  rectangle: -182.87,104.33 -167.13,159.45
  rectangle: -132.87,104.33 -117.13,159.45
  rectangle: -82.87,104.33 -67.13,159.45
  rectangle: -32.87,104.33 -17.13,159.45
  rectangle: 17.13,104.33 32.87,159.45
  rectangle: 67.13,104.33 82.87,159.45
  rectangle: 117.13,104.33 132.87,159.45
  rectangle: 167.13,104.33 182.87,159.45
  rectangle: 166.73,-159.45 182.48,-104.33
  rectangle: 116.73,-159.45 132.48,-104.33
  rectangle: 66.73,-159.45 82.48,-104.33
  rectangle: 17.13,-159.45 32.87,-104.33
  rectangle: -33.27,-159.45 -17.52,-104.33
  rectangle: -83.27,-159.45 -67.52,-104.33
  rectangle: -133.27,-159.45 -117.52,-104.33
  rectangle: -182.87,-159.45 -167.13,-104.33
  lines w6: -197.44,-104.33 197.44,-104.33 ; -197.44,104.33 197.44,104.33

## SOP-20 [mil]
pads (20):
  rect 19.69x86.61 smd: 1(-225,-216.54) 2(-175,-216.54) 3(-125,-216.54) 4(-75,-216.54) 5(-25,-216.54) 6(25,-216.54) 7(75,-216.54) 8(125,-216.54) 9(175,-216.54) 10(225,-216.54) 11(225,216.54) 12(175,216.54) 13(125,216.54) 14(75,216.54) 15(25,216.54) 16(-25,216.54) 17(-75,216.54) 18(-125,216.54) 19(-175,216.54) 20(-225,216.54)
Top Overlay:
  circle w2: c-206.1,-96.46 r19.69
  lines w2: -255.32,-135.83 -255.32,135.83 cw(c-245.47,135.82) -245.47,145.67 245.87,145.67 cw(c245.67,136.02) 255.32,136.22 255.32,-135.83 cw(c245.47,-135.82) 245.47,-145.67 -245.47,-145.67 cw(c-245.47,-135.82) -255.32,-135.83
  lines w6: -255.35,155.51 -255.32,155.51 ; -255.32,155.51 255.32,155.51 cw(c255.32,145.67) 265.16,145.67 265.16,-145.67 cw(c255.32,-145.67) 255.32,-155.51 -255.32,-155.51 cw(c-255.33,-145.67) -265.16,-146.06 -265.16,145.67 cw(c-255.32,145.67) -255.32,155.51
Mechanical 16:
  rectangle: -231.89,155.51 -218.11,236.22
  rectangle: -181.89,155.51 -168.11,236.22
  rectangle: -131.89,155.51 -118.11,236.22
  rectangle: -81.89,155.51 -68.11,236.22
  rectangle: -31.89,155.51 -18.11,236.22
  rectangle: 18.11,155.51 31.89,236.22
  rectangle: 68.11,155.51 81.89,236.22
  rectangle: 118.11,155.51 131.89,236.22
  rectangle: 168.11,155.51 181.89,236.22
  rectangle: 218.11,155.51 231.89,236.22
  rectangle: -231.89,-236.22 -218.11,-155.51
  rectangle: -181.89,-236.22 -168.11,-155.51
  rectangle: -131.89,-236.22 -118.11,-155.51
  rectangle: -81.89,-236.22 -68.11,-155.51
  rectangle: -31.89,-236.22 -18.11,-155.51
  rectangle: 18.11,-236.22 31.89,-155.51
  rectangle: 68.11,-236.22 81.89,-155.51
  rectangle: 118.11,-236.22 131.89,-155.51
  rectangle: 168.11,-236.22 181.89,-155.51
  rectangle: 218.11,-236.22 231.89,-155.51